# Altium footprint library Lib_Global.PcbLib: 96 footprints (part 2 of 6)
Each footprint in its own frame and in the unit in brackets; x right, y up, seen from the top. Pads: shape width x height; smd on the part's side, far side on the other; paste and mask are expansions set on the pad; w line width, h text height; cw(c..) or ccw(c..) is an arc to the next point about the centre after c.
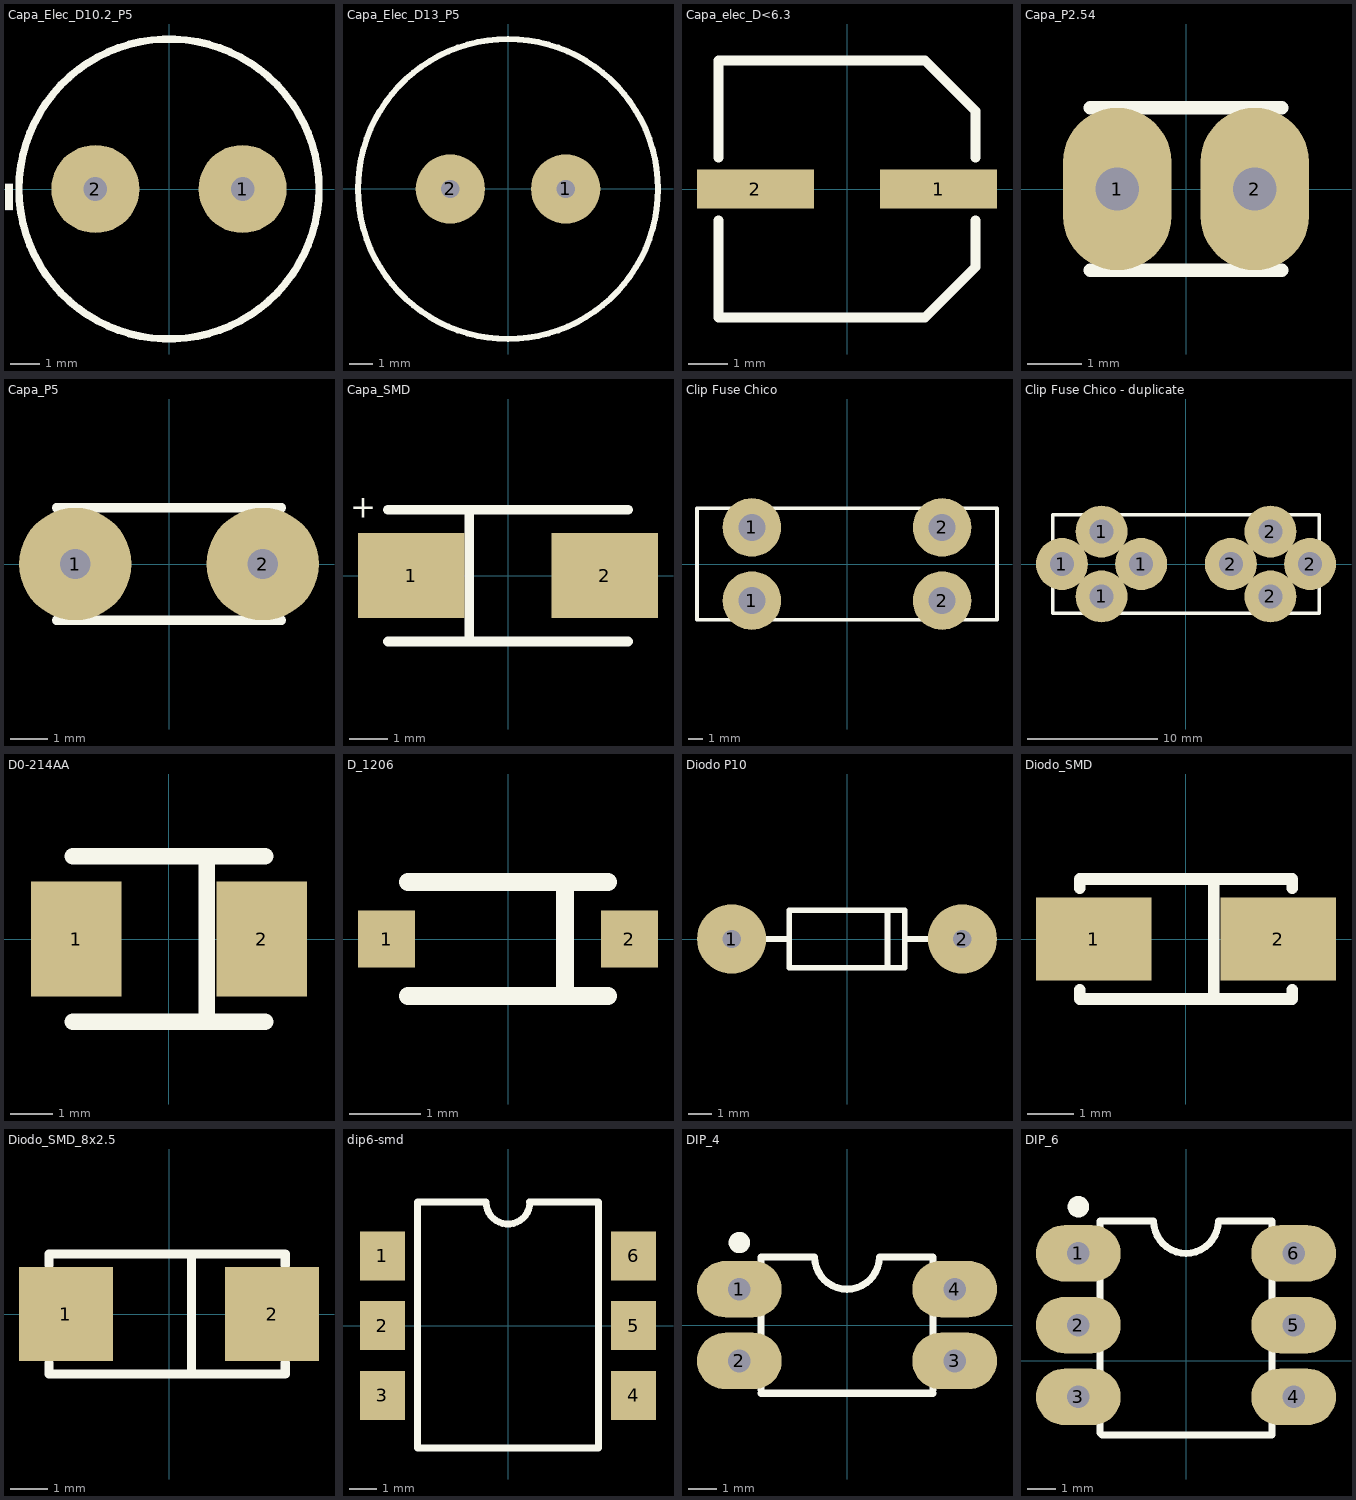
[diagram p1: the footprints below, top view; thin cyan lines are the x and y axes]

## Capa_Elec_D10.2_P5 [mm]
pads (2):
  round 3 hole 0.8: 1(2.5,0) 2(-2.5,0)
Top Overlay:
  circle w0.254: c0,0 r5.1
  text "-" at -4.5,-0.9 h2.5
3D body "User Library-Cap-EL(10x16-5).sldprt": height 16, standoff -3.3, extent -5.002,-5 5,5

## Capa_Elec_D13_P5 [mm]
pads (2):
  round 3 hole 0.8: 1(2.5,0) 2(-2.5,0)
Top Overlay:
  lines w0.254: 6.5,0 ccw(c0,0) 6.5,0
  text "-" at -6.4,-0.9 h2.5
3D body: height 0.25, standoff 0, extent -5.001,-5 5.001,5

## Capa_elec_D<6.3 [mm]
pads (2):
  rect 3x1 smd mask+0.102: 1(2.35,0) 2(-2.35,0)
Top Overlay:
  lines w0.25: -3.3,-0.8 -3.3,-3.3 2,-3.3 3.3,-2 3.3,-0.8 ; -3.3,0.8 -3.3,3.3 2,3.3 3.3,2 3.3,0.8
3D body "User Library-capacitor size D8.sldprt": height 7.71, standoff -0.01, extent -3.5,-3.3 3.5,3.3

## Capa_P2.54 [mm]
pads (2):
  oval 2x3 hole 0.8: 1(-1.27,0) 2(1.27,0)
Top Overlay:
  lines w0.25: -1.77,-1.5 1.77,-1.5 ; -1.77,1.5 1.77,1.5
3D body "User Library-Cer-Cap2 (3_5x1_5).sldprt": height 3.5, standoff -3, extent -1.868,-1.097 1.868,1.099

## Capa_P5 [mm]
pads (2):
  round 3 hole 0.8: 1(-2.5,0) 2(2.5,0)
Top Overlay:
  lines w0.25: -3,-1.5 3,-1.5 ; -3,1.5 3,1.5
3D body "User Library-Cer-Cap2_5 (5x1_5).sldprt": height 5, standoff -3, extent -2.915,-1.433 2.863,1.679

## Capa_SMD [mm]
pads (2):
  rect 2.75x2.2 smd: 1(-2.5,0) 2(2.5,0)
Top Overlay:
  lines w0.25: -3.1,-1.7 3.1,-1.7 ; -3.1,1.7 3.1,1.7 ; -1,-1.7 -1,1.7
  text "+" at -3.4,1.3 h1

## Clip Fuse Chico [mm]
pads (4):
  round 4 hole 1.85: 1(-6.5,-2.5) 1(-6.5,2.5) 2(6.5,-2.5) 2(6.5,2.5)
Top Overlay:
  lines w0.25: -10.25,-3.8 10.25,-3.8 10.25,3.8 -10.25,3.8 -10.25,-3.8

## Clip Fuse Chico - duplicate [mm]
pads (8):
  round 4 hole 1.85: 1(-9.548,0) 1(-6.5,-2.5) 1(-6.5,2.5) 1(-3.452,0) 2(3.452,0) 2(6.5,-2.5) 2(6.5,2.5) 2(9.548,0)
Top Overlay:
  lines w0.25: -10.25,-3.8 -10.25,3.8 10.25,3.8 10.25,-3.8 -10.25,-3.8
3D body "User Library-Fuse Small 1A.sldprt": height 9.05, standoff 3.95, extent -9.85,-2.547 9.85,2.547
3D body "User Library-Full Fuse_Fuse Leg_2009.SLDPRT": height 9.6, standoff -3.3, extent -9.548,-3.095 -3.452,3.095
3D body "User Library-Full Fuse_Fuse Leg_2009.SLDPRT": height 9.6, standoff -3.3, extent 3.452,-3.095 9.548,3.095

## D0-214AA [mm]
pads (2):
  rect 2.159x2.743 smd: 1(-2.21,0) 2(2.21,0)
Top Overlay:
  lines w0.4: -2.3,-1.975 2.3,-1.975 ; -2.3,1.975 2.3,1.975 ; 0.9,-1.975 0.9,1.9
3D body "User Library-DO-214AA SMB.sldprt": height 2.3, standoff 0, extent -2.7,-1.8 2.7,1.8

## D_1206 [mm]
pads (2):
  rect 0.8x0.8 smd: 1(-1.7,0) 2(1.7,0)
Top Overlay:
  lines w0.25: -1.4,-0.8 1.4,-0.8 ; -1.4,0.8 1.4,0.8 ; 0.8,-0.8 0.8,0.8

## Diodo P10 [mm]
pads (2):
  round 3 hole 0.8: 1(-5,0) 2(5,0)
Top Overlay:
  lines w0.25: -4.5,0 -2.5,0 ; 1.75,-1.25 1.75,1.25 ; 2.5,0 4.5,0 ; -2.5,-1.25 2.5,-1.25 2.5,1.25 -2.5,1.25 -2.5,-1.25
3D body "User Library-Silicone Diode 3_9x1_7.sldprt": height 1.95, standoff -1.78, extent -5.36,-0.95 5.36,0.943

## Diodo_SMD [mm]
pads (2):
  rect 2.5x1.8 smd: 1(-2,0) 2(2,0)
Top Overlay:
  lines w0.25: -2.3,-1.1 -2.3,-1.3 2.3,-1.3 2.3,-1.1 ; -2.3,1.1 -2.3,1.3 2.3,1.3 2.3,1.1 ; 0.6,-1.3 0.6,1.3
3D body "User Library-Diode SMD 1N4007.sldprt": height 2.4, standoff -0.03, extent -2.65,-1.555 2.65,1.555
3D body: height 2.45, standoff 2, extent 1.397,-1.524 1.778,1.524

## Diodo_SMD_8x2.5 [mm]
pads (2):
  rect 2.5x2.5 smd: 1(-2.75,0) 2(2.75,0)
Top Overlay:
  lines w0.25: -3.2,-1.3 -3.2,-1.6 3.1,-1.6 3.1,-1.3 ; -3.2,1.3 -3.2,1.6 3.1,1.6 3.1,1.3 ; 0.6,-1.5 0.6,1.5
3D body: height 0.25, standoff 0, extent 2.3,-1.3 2.3,-1.3
3D body: height 0.25, standoff 0, extent -3.15,-2.05 3.15,2.05

## dip6-smd [mm]
pads (6):
  rect 1.65x1.78 smd: 1(-4.57,2.54) 2(-4.57,0) 3(-4.57,-2.54) 4(4.57,-2.54) 5(4.57,0) 6(4.57,2.54)
Top Overlay:
  lines w0.25: 0.775,4.5 3.3,4.5 ; 0.8,4.5 cw(c0,4.5) -0.8,4.5 -3.3,4.5 -3.3,-4.45 3.3,-4.45 3.3,4.45
3D body "User Library-DIP-6-SMD.sldprt": height 3.69, standoff -0.02, extent -4.95,-3.525 4.85,3.725

## DIP_4 [mm]
pads (4):
  oval 3x2 hole 0.8: 1(-3.81,1.27) 2(-3.81,-1.27) 3(3.81,-1.27) 4(3.81,1.27)
Top Overlay:
  circle w0.5: c-3.81,2.921 r0.127
  lines w0.25: -3.048,-2.413 3.048,-2.413 ; -3.048,-2.3 -3.048,2.413 -1.143,2.413 ccw(c0,2.413) 1.143,2.413 3.048,2.413 3.048,-2.3
3D body "PC817X4NSZ1B.stp": height 4.55, standoff -3.5, extent -3.96,-2.3 3.96,2.3

## DIP_6 [mm]
pads (6):
  oval 3x2 hole 0.8: 1(-3.81,3.81) 2(-3.81,1.27) 3(-3.81,-1.27) 4(3.81,-1.27) 5(3.81,1.27) 6(3.81,3.81)
Top Overlay:
  circle w0.5: c-3.81,5.461 r0.127
  lines w0.25: -3.048,-2.552 -2.976,-2.623 -0.323,-2.623 3.048,-2.623 3.048,4.953 1.143,4.953 cw(c0,4.953) -1.143,4.953 -3.048,4.953 -3.048,-2.552
3D body: height 0.25, standoff 0, extent -3.81,-2.4 3.81,4.8